# Altium footprint library Mi Libreria.PcbLib: 184 footprints (part 3 of 12)
Each footprint in its own frame and in the unit in brackets; x right, y up, seen from the top. Pads: shape width x height; smd on the part's side, far side on the other; paste and mask are expansions set on the pad; w line width, h text height; cw(c..) or ccw(c..) is an arc to the next point about the centre after c.
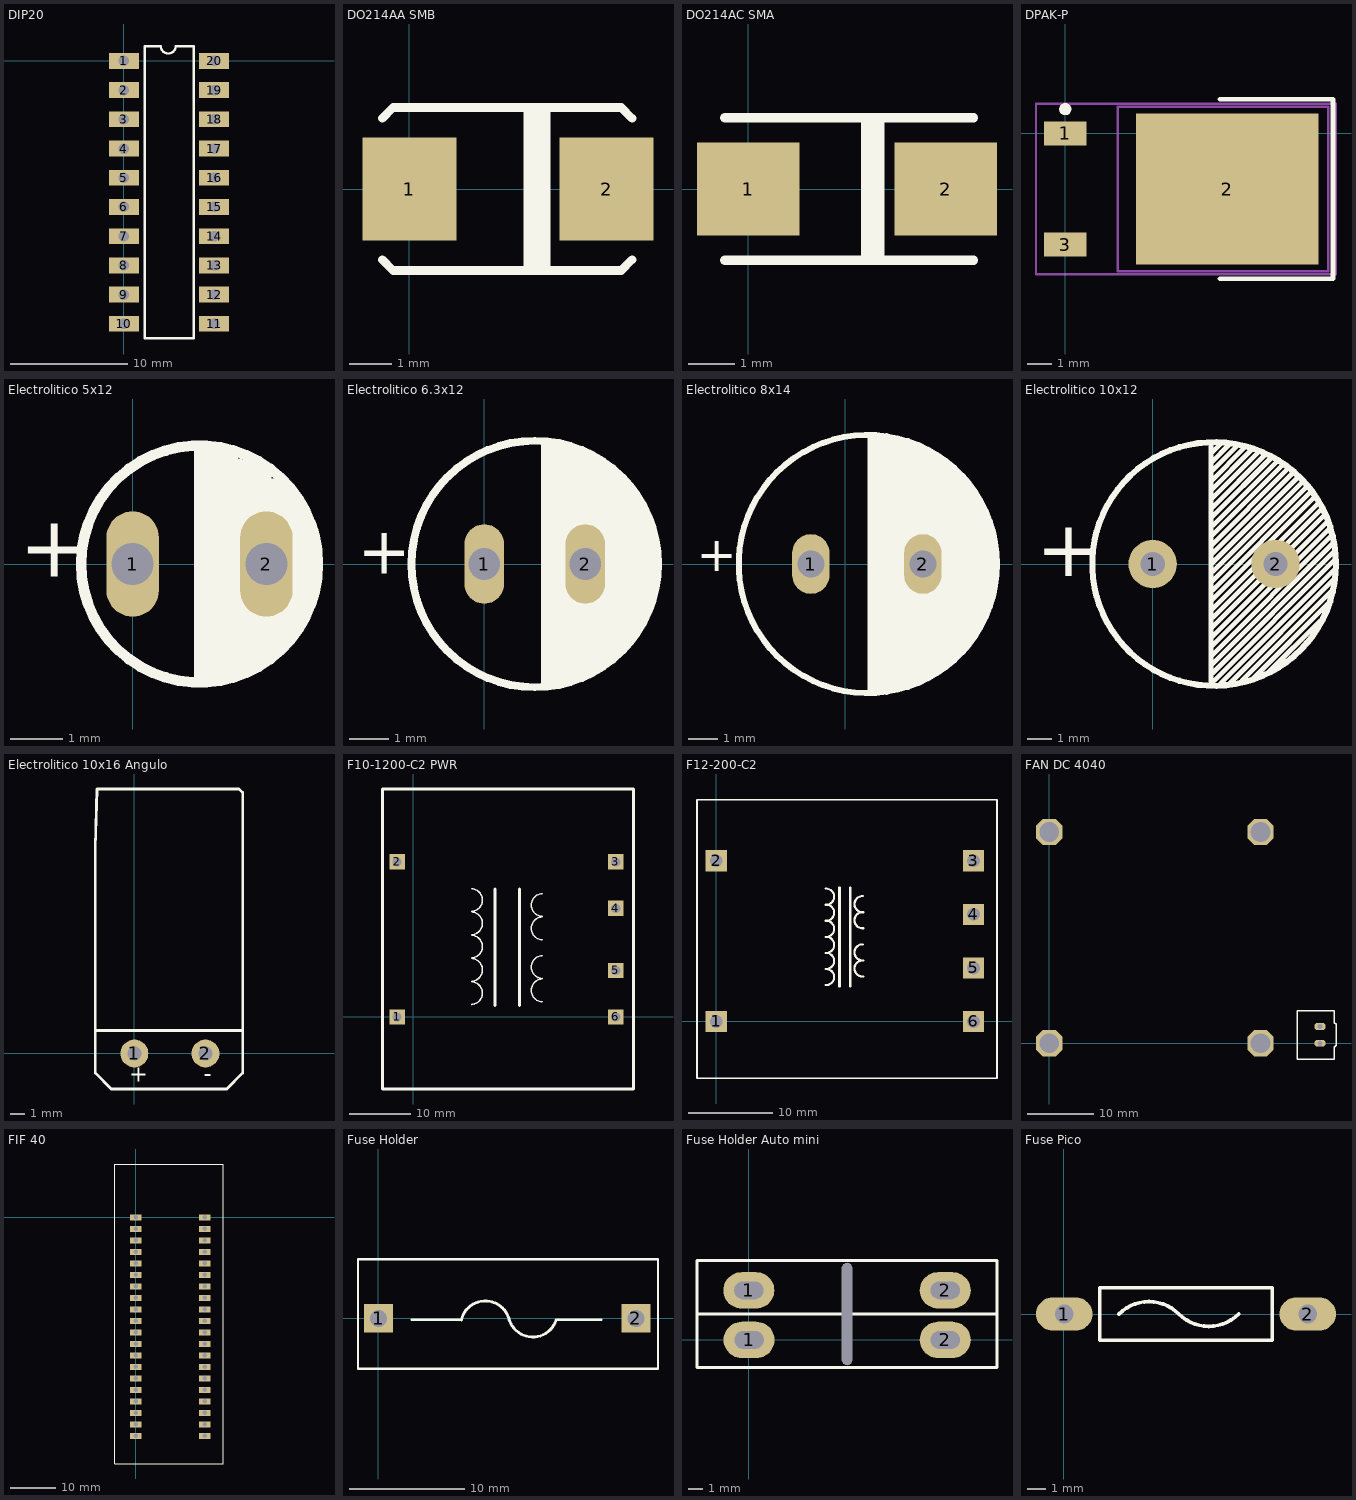
[diagram p2: the footprints below, top view; thin cyan lines are the x and y axes]

## DIP20 [mm] "DIP 20"
pads (20):
  rect 2.6x1.35 hole 0.9: 1(0,0) 2(0,-2.5) 3(0,-5) 4(0,-7.5) 5(0,-10) 6(0,-12.5) 7(0,-15) 8(0,-17.5) 9(0,-20) 10(0,-22.5) 11(7.707,-22.5) 12(7.707,-20) 13(7.707,-17.5) 14(7.707,-15) 15(7.707,-12.5) 16(7.707,-10) 17(7.707,-7.5) 18(7.707,-5) 19(7.707,-2.5) 20(7.707,0)
Top Overlay:
  lines w0.2: 1.778,-23.75 5.969,-23.75 5.969,1.25 4.415,1.25 cw(c3.79,1.25) 3.165,1.25 1.778,1.25 1.778,-23.75
3D body "User Library-DIP20.STEP": height 5.07, standoff -3.31, extent -0.1,-24.446 7.72,2.094

## DO214AA SMB [mm] "Diodo Proposito General SMD 3A"
pads (2):
  rect 2.2x2.4 smd: 1(0,0) 2(4.612,0)
Top Overlay:
  rectangle: 2.667,-1.905 3.302,1.905
  lines w0.2: -0.635,-1.651 -0.381,-1.905 4.953,-1.905 5.207,-1.651 ; -0.635,1.651 -0.381,1.905 4.953,1.905 5.207,1.651
3D body "DO-214AA_SMB.step": height 2.3, standoff 0.05, extent -0.364,-1.85 4.936,1.85

## DO214AC SMA [mm] "Diodo Proposito General"
pads (2):
  rect 2.2x2 smd: 1(0,0) 2(4.231,0)
Top Overlay:
  rectangle: 2.413,-1.524 2.921,1.524
  lines w0.2: -0.508,-1.524 4.826,-1.524 ; -0.508,1.524 4.826,1.524
3D body "DIDODOSMD.STEP": height 2.34, standoff 0.06, extent -0.564,-1.397 4.922,1.397

## DPAK-P [mm] "DPAK"
pads (3):
  rect 1.75x1 smd: 1(-0.005,-0.006) 3(-0.005,-4.566)
  rect 7.5x6.2 smd: 2(6.653,-2.286)
Top Overlay:
  circle w0.25: c-0.005,0.994 r0.125
  lines w0.2: 6.35,-5.969 10.986,-5.969 10.986,1.397 6.35,1.397
Mechanical 13:
  lines w0.1: 2.145,-5.661 2.145,1.089 10.795,1.089 10.795,-5.661 2.145,-5.661
Mechanical 15:
  lines w0.1: 3.945,-2.286 4.945,-2.286 ; 4.445,-2.786 4.445,-1.786 ; -1.206,-5.786 -1.206,1.214 11.112,1.214 11.112,-5.786 -1.206,-5.786
3D body "DPAK.STEP": height 2.39, standoff -0.02, extent -0.477,-5.556 9.462,0.984

## Electrolitico 5x12 [mm] "Capacitor Electrolitico 5x12mm"
pads (2):
  oval 1x2 hole 0.8: 1(0,0) 2(2.54,0)
Top Overlay:
  circle w0.2: c1.27,0 r2.25
  lines w0.2: 1.27,-2.159 1.27,2.159 ; 1.397,-2.159 1.397,2.159 ; 1.524,-2.159 1.524,2.159 ; 1.651,-2.159 1.651,2.159 ; 1.778,-2.159 1.778,2.159 ; 1.905,2.159 1.905,-2.159 2.032,-2.032 2.032,1.905 ; 2.159,-1.905 2.159,1.905 ; 2.286,-1.905 2.286,1.905 ; 2.413,-1.905 2.413,1.778 ; 2.54,1.778 2.54,-1.778 2.667,-1.651 2.667,1.524 ; 2.794,-1.524 2.794,1.524 ; 2.921,-1.397 2.921,1.524 ; 3.048,-1.143 3.048,1.27 ; 3.175,-1.143 3.175,1.143 ; 3.302,-0.889 3.302,0.889 ; 3.429,-0.508 3.429,0.635
  text "+" at -2.159,-0.635 h2
3D body "ELEC5X12CAP.step": height 12.97, standoff -2.13, extent -1.27,-2.538 3.81,2.538

## Electrolitico 6.3x12 [mm] "Capacitor Electrolitico 6.3x12mm"
pads (2):
  oval 1x2 hole 0.8: 1(0,0) 2(2.54,0)
Top Overlay:
  circle w0.2: c1.27,0 r3.1
  region: 1.524,3.048 1.524,-3.048 1.835,-3.048 1.962,-2.921 2.447,-2.921 2.701,-2.667 2.794,-2.667 3.048,-2.413 3.302,-2.413 3.556,-2.159 3.556,-2.032 3.937,-1.651 3.937,-1.397 4.064,-1.27 4.064,-1.143 4.191,-1.016 4.191,-0.748 4.37,-0.569 4.37,0.329 4.318,0.381 4.318,0.889 4.064,1.143 4.064,1.524 2.76,2.828 2.54,2.828
  lines w0.2: 1.524,-3.048 1.524,3.048
  text "+" at -3.175,-0.635 h2
3D body "C-VERT__D-6,3__L-9__P-2,5__TMP-105__C-1u__U-16.stp": height 9.5, standoff -3, extent -1.856,-3.15 4.445,3.15

## Electrolitico 8x14 [mm] "Capacitor Electrolitico 8x14"
pads (2):
  oval 1.25x2 hole 0.9: 1(-1.143,0) 2(2.6,0)
Top Overlay:
  circle w0.2: c0.762,0 r4.32
  region: 0.762,-4.318 0.762,4.318 1.016,4.318 1.27,4.318 1.651,4.191 2.032,4.064 2.413,3.937 2.921,3.683 3.175,3.556 3.937,2.921 4.572,1.905 4.953,1.016 5.08,0 4.953,-1.143 4.572,-2.159 3.429,-3.302 3.175,-3.556 2.794,-3.81 2.159,-4.064 1.778,-4.191 1.651,-4.191
  text "+" at -4.953,-0.635 h2
3D body "ELEC8X14CAP.step": height 14.65, standoff -2.65, extent -3.374,-4.191 4.826,4.009

## Electrolitico 10x12 [mm] "Capacitor Electrolitico 10x12mm"
pads (2):
  round 2 hole 1: 1(0,0) 2(5.08,0)
Top Overlay:
  circle w0.254: c2.54,0 r5.039
  lines w0.2: 2.413,-4.953 2.413,4.953 ; 2.413,-4.191 7.493,0.889 ; 2.413,-3.81 7.429,1.206 ; 2.413,-3.429 7.302,1.46 ; 2.413,-3.048 7.175,1.714 ; 2.413,-1.905 6.858,2.54 ; 2.413,-1.524 6.667,2.73 ; 2.413,-0.762 6.35,3.175 ; 2.413,0 6.032,3.619 ; 2.413,0.381 5.842,3.81 ; 2.413,0.762 5.524,3.873 ; 2.413,1.143 5.334,4.064 ; 2.413,2.286 4.635,4.508 ; 2.413,3.048 4.064,4.699 ; 2.413,3.429 3.81,4.826 ; 2.413,3.81 3.492,4.889 ; 2.413,4.191 3.175,4.953 ; 2.413,4.572 2.794,4.953 ; 2.476,-4.508 7.493,0.508 ; 2.476,-2.603 7.112,2.032 ; 2.476,-2.222 6.985,2.286 ; 2.476,-1.079 6.54,2.984 ; 2.476,-0.318 6.159,3.365 ; 2.476,1.587 5.143,4.255 ; 2.476,1.968 4.953,4.445 ; 2.476,2.73 4.318,4.572 ; 2.54,-4.826 7.556,0.191 ; 2.794,-4.953 7.493,-0.254 ; 3.175,-4.953 7.493,-0.635 ; 3.683,-4.826 7.366,-1.143 ; 4.127,-4.763 7.302,-1.587 ; 4.763,-4.508 6.921,-2.349
  text "+" at -4.826,-1.27 h4
3D body "Electrolitico 10x12.step": height 12.7, standoff -2.7, extent -2.499,-5.062 7.62,5.063

## Electrolitico 10x16 Angulo [mm] "Capacitor Electrolitico 10x16mm en 90 grados"
pads (2):
  round 2 hole 1: 1(0,0) 2(5.08,0)
Top Overlay:
  lines w0.2: -2.667,1.651 7.747,1.651 ; -2.794,-1.397 -1.651,-2.54 6.604,-2.54 7.747,-1.397 7.747,18.669 7.493,18.923 -2.667,18.923 -2.794,14.732 -2.794,-0.127 -2.794,-1.397
  text "-" at 4.953,-2.413 h2
  text "+" at -0.381,-2.413 h2
3D body "ElCapLA-5.0-10x16.step": height 10.1, standoff -3, extent -2.508,-0.111 7.493,18.589

## F10-1200-C2 PWR [mm] "Transformador 10VCt 1.2A"
pads (6):
  rect 2.5x2.5 hole 1.5: 1(-2.667,0) 2(-2.667,25.4) 3(33.147,25.4) 4(33.147,17.78) 5(33.147,7.62) 6(33.147,0)
Top Overlay:
  lines w0.254: 9.525,2.032 ccw(c9.423,3.904) 9.525,5.777 ; 9.525,5.842 ccw(c9.423,7.714) 9.525,9.587 ; 9.525,9.652 ccw(c9.423,11.524) 9.525,13.397 ; 9.525,13.462 ccw(c9.423,15.334) 9.525,17.207 ; 9.525,17.272 ccw(c9.423,19.144) 9.525,21.017 ; 21.082,2.478 cw(c21.184,4.351) 21.082,6.223 ; 21.082,6.288 cw(c21.184,8.161) 21.082,10.033 ; 21.082,12.638 cw(c21.184,14.511) 21.082,16.383 ; 21.082,16.448 cw(c21.184,18.321) 21.082,20.193
  lines w0.5: 13.335,1.905 13.335,20.955 ; 17.399,1.905 17.399,20.955 ; -5.08,-11.811 36.068,-11.811 36.068,37.338 -5.08,37.338 -5.08,-11.811
3D body: height 7, standoff -3, extent -3.262,-0.599 -2.067,0.599
3D body: height 7, standoff -3, extent -3.262,24.801 -2.067,25.999
3D body: height 7, standoff -3, extent 32.552,24.801 33.747,25.999
3D body: height 7, standoff -3, extent 32.552,17.181 33.747,18.379
3D body: height 7, standoff -3, extent 32.425,7.021 33.62,8.219
3D body: height 7, standoff -3, extent 32.425,-0.599 33.62,0.599
3D body: height 34, standoff 4, extent 6.985,-0.508 14.478,26.289
3D body: height 37, standoff 2, extent 5.334,-1.778 7.239,27.559
3D body: height 11, standoff 1, extent 1.905,1.651 5.334,28.702
3D body: height 37, standoff 2, extent 14.351,-1.778 16.256,27.559
3D body: height 34, standoff 4, extent 16.256,-0.508 23.622,26.289
3D body: height 37, standoff 2, extent 23.368,-1.778 25.273,27.559
3D body: height 11, standoff 1, extent 25.273,1.524 28.575,28.702
3D body: height 9, standoff 6, extent -3.262,24.638 1.31,26.162
3D body: height 9, standoff 6, extent -3.429,-0.762 1.143,0.762
3D body: height 9, standoff 6, extent 29.337,24.638 33.909,26.162
3D body: height 9, standoff 6, extent 29.337,17.018 33.909,18.542
3D body: height 9, standoff 6, extent 29.21,6.858 33.782,8.382
3D body: height 9, standoff 6, extent 29.21,-0.762 33.782,0.762
3D body: height 30, standoff 10, extent 1.905,28.829 28.448,36.449
3D body: height 30, standoff 10, extent 1.905,-11.049 28.448,-3.048
3D body: height 30, standoff 10, extent -4.318,-11.049 4.826,36.449
3D body: height 30, standoff 10, extent 26.162,-11.049 35.306,36.449

## F12-200-C2 [mm] "Transformador 12V"
pads (6):
  rect 2.5x2.5 hole 1.5: 1(0,0) 2(0,19.05) 3(30.48,19.05) 4(30.48,12.7) 5(30.48,6.35) 6(30.48,0)
Top Overlay:
  lines w0.2: -2.286,-6.731 33.274,-6.731 33.274,26.289 -2.286,26.289 -2.286,-6.731
  lines w0.254: 12.931,6.221 cw(c13.018,5.271) 12.954,4.318 ; 12.931,8.126 cw(c13.018,7.175) 12.954,6.223 ; 12.931,10.031 cw(c13.018,9.08) 12.954,8.128 ; 12.931,11.936 cw(c13.018,10.986) 12.954,10.033 ; 12.931,13.841 cw(c13.018,12.89) 12.954,11.938 ; 12.931,15.746 cw(c13.018,14.795) 12.954,13.843 ; 17.399,7.239 ccw(c17.335,6.286) 17.422,5.336 ; 17.399,9.144 ccw(c17.335,8.191) 17.422,7.241 ; 17.399,12.954 ccw(c17.335,12.002) 17.422,11.051 ; 17.399,14.859 ccw(c17.335,13.906) 17.422,12.956
  lines w0.3: 14.605,4.191 14.605,15.875 ; 15.875,4.191 15.875,15.875
3D body: height 7, standoff -3, extent -0.595,-0.599 0.6,0.599
3D body: height 7, standoff -3, extent -0.595,18.451 0.6,19.649
3D body: height 7, standoff -3, extent 29.885,18.451 31.08,19.649
3D body: height 7, standoff -3, extent 29.885,12.101 31.08,13.299
3D body: height 7, standoff -3, extent 29.885,5.751 31.08,6.949
3D body: height 7, standoff -3, extent 29.885,-0.599 31.08,0.599
3D body: height 30, standoff 4, extent 6.985,2.286 14.478,17.526
3D body: height 32, standoff 2, extent 5.334,1.778 6.985,17.907
3D body: height 11, standoff 1, extent 1.905,-1.27 5.334,20.32
3D body: height 32, standoff 2, extent 14.478,1.778 16.129,17.907
3D body: height 30, standoff 4, extent 16.129,2.286 23.622,17.526
3D body: height 32, standoff 2, extent 23.622,1.778 25.273,17.907
3D body: height 11, standoff 1, extent 25.273,-1.397 28.575,20.447
3D body: height 9, standoff 6, extent -0.762,18.288 3.81,19.812
3D body: height 9, standoff 6, extent -0.762,-0.762 3.81,0.762
3D body: height 9, standoff 6, extent 26.67,18.288 31.242,19.812
3D body: height 9, standoff 6, extent 26.67,11.938 31.242,13.462
3D body: height 9, standoff 6, extent 26.67,5.588 31.242,7.112
3D body: height 9, standoff 6, extent 26.67,-0.762 31.242,0.762
3D body: height 23, standoff 10, extent 1.905,18.669 28.448,26.289
3D body: height 23, standoff 10, extent 1.905,-6.731 28.448,1.27
3D body: height 23, standoff 10, extent -2.286,-6.731 4.826,26.289
3D body: height 23, standoff 10, extent 26.162,-6.731 33.274,26.289

## FAN DC 4040 [mm] "DC Fan 404010"
pads (6):
  oct 1.7x1 hole 0.762: 1(41,0) 2(41,2.54)
  oct 4x4 hole 3: ""(0,0) ""(0,32) ""(32,0) ""(32,32)
Top Overlay:
  lines w0.2: 37.592,-2.413 43.18,-2.413 43.18,-0.572 43.434,-0.318 43.434,2.857 43.18,3.111 43.18,4.953 37.592,4.953 37.592,-2.413
3D body "JST 2X2.54mm.step": height 7, standoff -3.3, extent 37.536,-2.413 43.236,5.087
3D body "FAN4040.step": height 25, standoff 15, extent -3.998,-3.998 36.002,36.002
3D body: height 20, standoff 0, extent 29.968,-2.032 34.032,2.032
3D body: height 20, standoff 0, extent 29.968,29.968 34.032,34.032
3D body: height 20, standoff 0, extent -2.032,29.968 2.032,34.032
3D body: height 20, standoff 0, extent -2.032,-2.032 2.032,2.032

## FIF 40 [mm] "BASE ZIF 40 P"
pads (40):
  rect 2.5x1.3 hole 1: 1(0,0) 2(0,-2.54) 3(0,-5.08) 4(0,-7.62) 5(0,-10.16) 6(0,-12.7) 7(0,-15.24) 8(0,-17.78) 9(0,-20.32) 10(0,-22.86) 11(0,-25.4) 12(0,-27.94) 13(0,-30.48) 14(0,-33.02) 15(0,-35.56) 16(0,-38.1) 17(0,-40.64) 18(0,-43.18) 19(0,-45.72) 20(0,-48.26) 21(15.254,-48.26) 22(15.254,-45.72) 23(15.254,-43.18) 24(15.254,-40.64) 25(15.254,-38.1) 26(15.254,-35.56) 27(15.254,-33.02) 28(15.254,-30.48) 29(15.254,-27.94) 30(15.254,-25.4) 31(15.254,-22.86) 32(15.254,-20.32) 33(15.254,-17.78) 34(15.254,-15.24) 35(15.254,-12.7) 36(15.254,-10.16) 37(15.254,-7.62) 38(15.254,-5.08) 39(15.254,-2.54) 40(15.254,0)
Top Overlay:
  lines w0.254: -4.572,-54.483 -4.572,11.811 19.3,11.811 19.3,-54.483 -4.572,-54.483
3D body "ZIF40.STEP": height 12, standoff -4, extent -4.694,-54.356 19.172,22.835

## Fuse Holder [mm] "Holder 20x5"
pads (2):
  rect 2.5x2.5 hole 1.5: 1(0.017,0) 2(22.462,0)
Top Overlay:
  lines w0.2: 2.921,-0.127 7.239,-0.127 ; 15.505,-0.127 19.431,-0.127 ; -1.778,-4.381 -1.778,5.143 24.384,5.143 24.384,-4.381 -1.778,-4.381
  lines w0.254: 7.239,-0.127 cw(c9.322,-0.615) 11.405,-0.127 ; 11.379,0.02 ccw(c13.462,0.508) 15.505,-0.127
3D body "Fuse_Holder.STEP": height 14.44, standoff -4.4, extent -0.329,-4.119 22.831,4.881

## Fuse Holder Auto mini [mm] "0891020.NXS Compa"
pads (5):
  oval 3.5x2.5 hole 1.2 slot 2 at 0 deg: 1(0,3.4) 1(0.017,0) 2(13.47,0) 2(13.47,3.4)
  round 0 hole 0.7 slot 7 at 90 deg: non(6.735,1.778)
Top Overlay:
  lines w0.2: -3.556,1.778 17.018,1.778 ; -3.556,-1.905 -3.556,5.461 17.018,5.461 17.018,-1.905 -3.556,-1.905
3D body "keystone-PN3557-15.STEP": height 8.04, standoff -2.12, extent -3.175,-1.588 16.637,5.143

## Fuse Pico [mm] "Fuse Pico II"
pads (2):
  oval 3x1.75 hole 1: 1(0.017,0) 2(12.937,0)
Top Overlay:
  lines w0.2: 2.921,0 cw(c4.508,-1.587) 6.096,0 ccw(c7.683,1.587) 9.271,0 ; 1.905,-1.397 1.905,1.397 11.049,1.397 11.049,-1.397 1.905,-1.397
3D body "FusePico.step": height 3.21, standoff -2.5, extent -0.343,-1.205 13.297,1.205